# Altium footprint library ST Microelectronics STM32 G4.PcbLib: 21 footprints (part 3 of 3)
Each footprint in its own frame and in the unit in brackets; x right, y up, seen from the top. Pads: shape width x height; smd on the part's side, far side on the other; paste and mask are expansions set on the pad; w line width, h text height; cw(c..) or ccw(c..) is an arc to the next point about the centre after c.
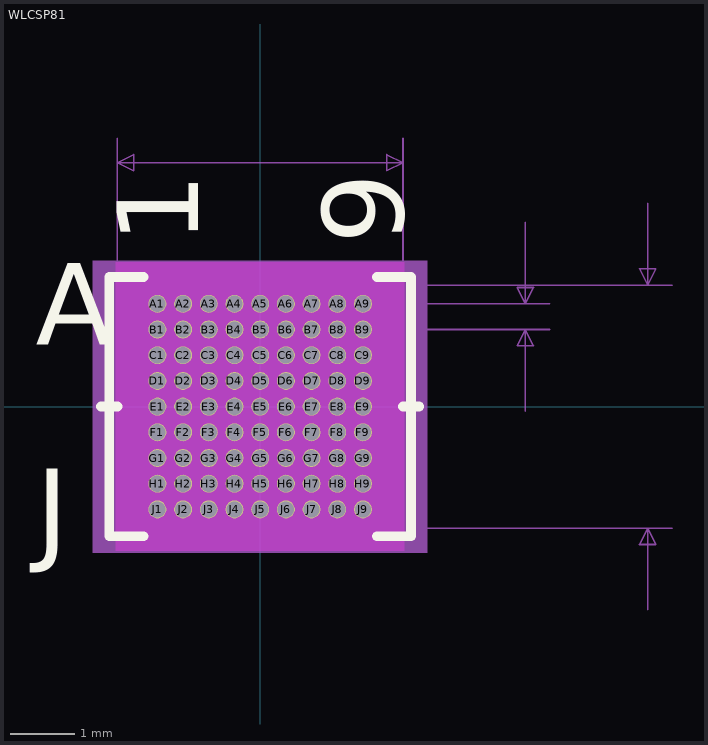
[diagram p2: the footprint, top view; thin cyan lines are the x and y axes]

## WLCSP81 [mil]
pads (81):
  round 11 hole 10 mask+0: A1(-62.99,62.99) A2(-47.24,62.99) A3(-31.5,62.99) A4(-15.75,62.99) A5(0,62.99) A6(15.75,62.99) A7(31.5,62.99) A8(47.24,62.99) A9(62.99,62.99) B1(-62.99,47.24) B2(-47.24,47.24) B3(-31.5,47.24) B4(-15.75,47.24) B5(0,47.24) B6(15.75,47.24) B7(31.5,47.24) B8(47.24,47.24) B9(62.99,47.24) C1(-62.99,31.5) C2(-47.24,31.5) C3(-31.5,31.5) C4(-15.75,31.5) C5(0,31.5) C6(15.75,31.5) C7(31.5,31.5) C8(47.24,31.5) C9(62.99,31.5) D1(-62.99,15.75) D2(-47.24,15.75) D3(-31.5,15.75) D4(-15.75,15.75) D5(0,15.75) D6(15.75,15.75) D7(31.5,15.75) D8(47.24,15.75) D9(62.99,15.75) E1(-62.99,0) E2(-47.24,0) E3(-31.5,0) E4(-15.75,0) E5(0,0) E6(15.75,0) E7(31.5,0) E8(47.24,0) E9(62.99,0) F1(-62.99,-15.75) F2(-47.24,-15.75) F3(-31.5,-15.75) F4(-15.75,-15.75) F5(0,-15.75) F6(15.75,-15.75) F7(31.5,-15.75) F8(47.24,-15.75) F9(62.99,-15.75) G1(-62.99,-31.5) G2(-47.24,-31.5) G3(-31.5,-31.5) G4(-15.75,-31.5) G5(0,-31.5) G6(15.75,-31.5) G7(31.5,-31.5) G8(47.24,-31.5) G9(62.99,-31.5) H1(-62.99,-47.24) H2(-47.24,-47.24) H3(-31.5,-47.24) H4(-15.75,-47.24) H5(0,-47.24) H6(15.75,-47.24) H7(31.5,-47.24) H8(47.24,-47.24) H9(62.99,-47.24) J1(-62.99,-62.99) J2(-47.24,-62.99) J3(-31.5,-62.99) J4(-15.75,-62.99) J5(0,-62.99) J6(15.75,-62.99) J7(31.5,-62.99) J8(47.24,-62.99) J9(62.99,-62.99)
Top Overlay:
  lines w6: -97.5,0 -87.5,0 ; -71.56,-79.5 -92.5,-79.5 -92.5,79.5 -71.56,79.5 ; 71.56,-79.5 92.5,-79.5 92.5,79.5 71.56,79.5 ; 87.5,0 97.5,0
  text "9" at 87.99,99.5 h50
  text "1" at -37.99,99.5 h50
  text "J" at -137.5,-87.99 h50
  text "A" at -137.5,37.99 h50
Bottom Overlay:
  text "9" at 37.99,99.5 h50
  text "1" at -87.99,99.5 h50
  text "J" at -112.5,-87.99 h50
  text "A" at -112.5,37.99 h50
Keep-Out Layer:
  region: -88.37,-88.37 -88.37,88.37 88.37,88.37 88.37,-88.37
Mechanical 5:
  region: 102.5,-89.5 -102.5,-89.5 -102.5,89.5 102.5,89.5
Mechanical 7:
  lines w1: -87.5,0 -87.5,164.5 ; 0,-74.5 252.5,-74.5 ; 0,74.5 252.5,74.5 ; 62.99,47.24 177.5,47.24 ; 62.99,62.99 177.5,62.99 ; 87.5,0 87.5,164.5 ; 162.5,-2.76 162.5,47.24 ; 162.5,112.99 162.5,62.99 ; 237.5,-124.5 237.5,-74.5 ; 237.5,124.5 237.5,74.5 ; -87.5,149.5 -77.5,144.5 -77.5,154.5 -87.5,149.5 ; -87.5,149.5 87.5,149.5 ; 87.5,149.5 77.5,144.5 77.5,154.5 87.5,149.5 ; 162.5,47.24 167.5,37.24 157.5,37.24 162.5,47.24 ; 162.5,62.99 167.5,72.99 157.5,72.99 162.5,62.99 ; 237.5,-74.5 242.5,-84.5 232.5,-84.5 237.5,-74.5 ; 237.5,74.5 242.5,84.5 232.5,84.5 237.5,74.5
  text "0.149in/3.785mm" at 257.5,-12.5 h25
  text "0.175in/4.445mm" at -93.75,169.5 h25
  text "0.016in/0.4mm" at 182.5,42.62 h25
  text "Default Padstyle: EX11Y11D10PA" at -375,-274.5 h50
Mechanical 13:
  lines w1: -87.5,66.63 -79.63,74.5 ; -87.5,-74.5 -87.5,74.5 87.5,74.5 87.5,-74.5 -87.5,-74.5
  text "9" at 87.99,99.5 h50
  text "1" at -37.99,99.5 h50
  text "J" at -137.5,-87.99 h50
  text "A" at -137.5,37.99 h50
Mechanical 15:
  region: 97.5,-84.5 -97.5,-84.5 -97.5,84.5 97.5,84.5
  lines w6: -97.5,-84.5 97.5,-84.5 97.5,84.5 -97.5,84.5 -97.5,-84.5
3D body "WLCSP81.step": height 23.11, standoff 0.01, extent -87.48,-74.48 87.49,74.5